# Altium footprint library smd-ipc.PCBLIB: 363 footprints (part 6 of 27)
Each footprint in its own frame and in the unit in brackets; x right, y up, seen from the top. Pads: shape width x height; smd on the part's side, far side on the other; paste and mask are expansions set on the pad; w line width, h text height; cw(c..) or ccw(c..) is an arc to the next point about the centre after c.
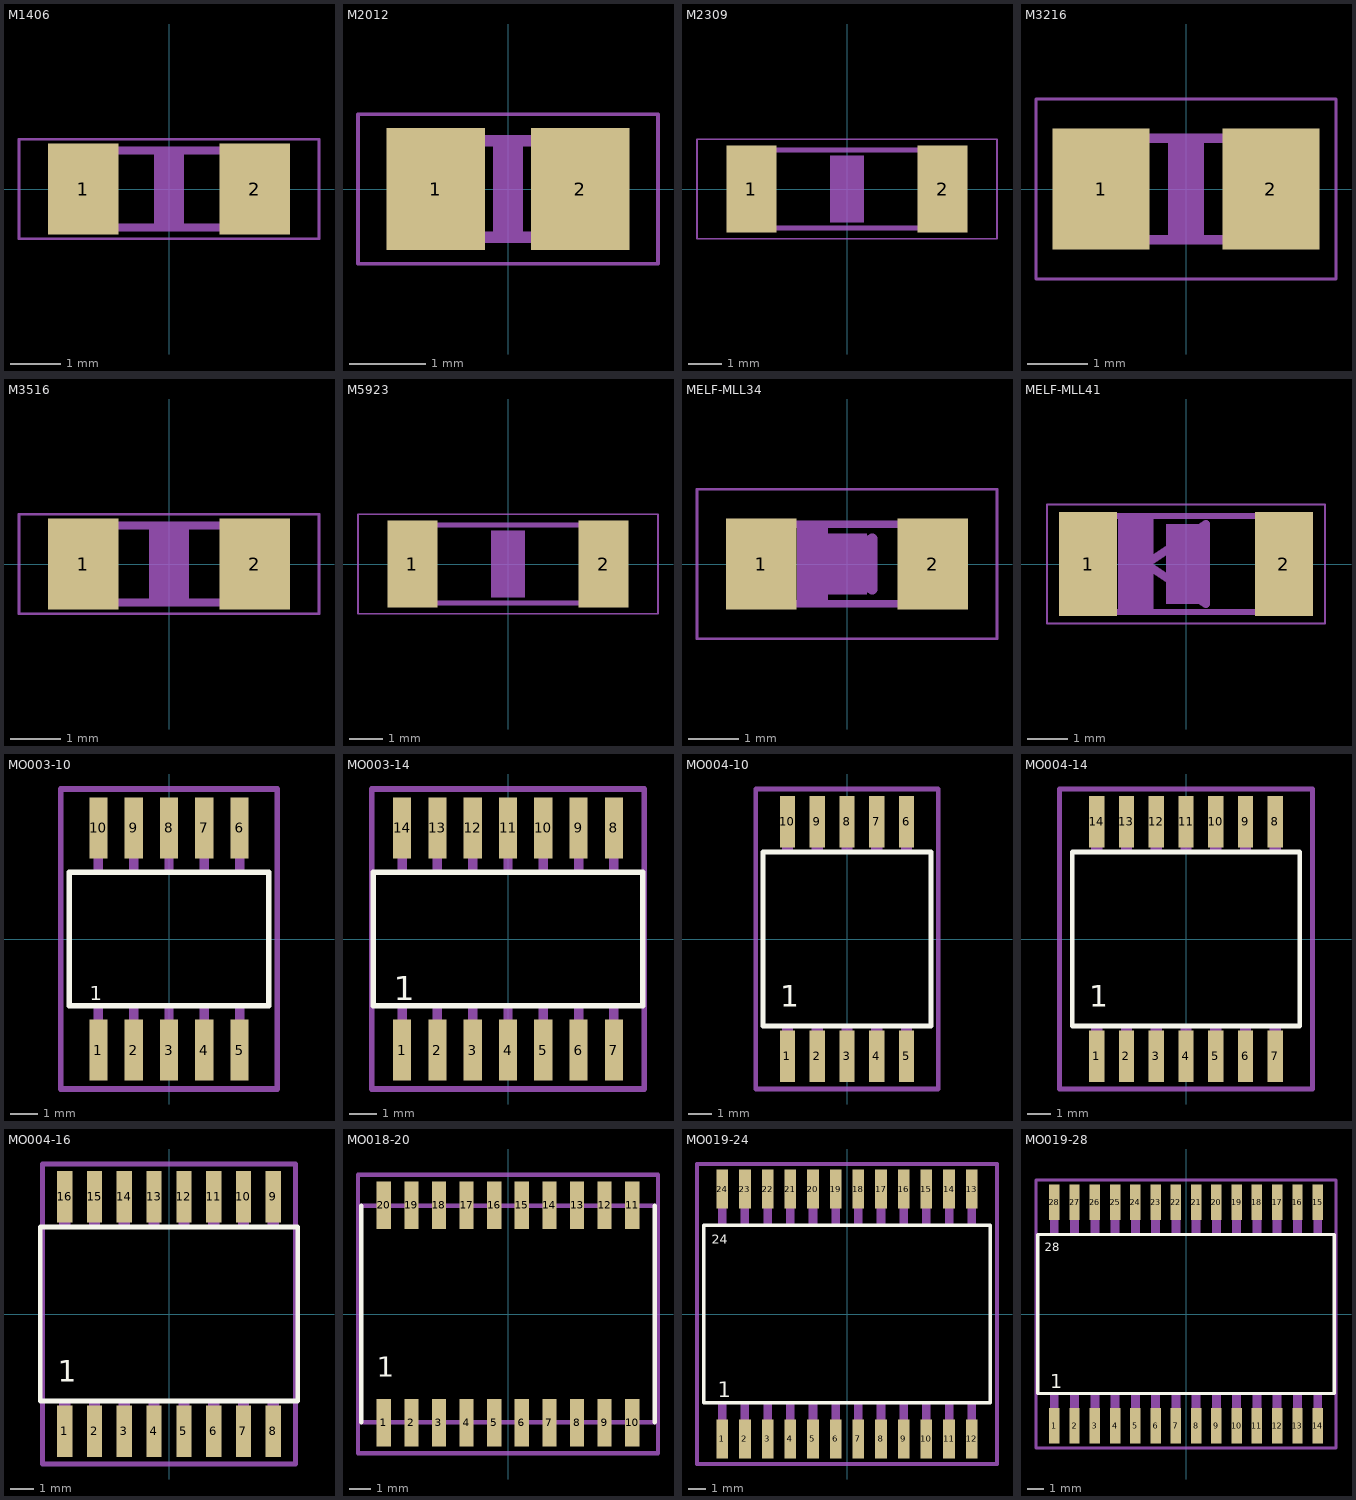
[diagram p5: the footprints below, top view; thin cyan lines are the x and y axes]

## M1406 [mm]
pads (2):
  rect 1.4x1.8 smd: 1(-1.7,0) 2(1.7,0)
Mechanical 6:
  rectangle: -0.3,-0.7 0.3,0.7
Mechanical 16:
  rectangle: -1.854,-0.838 -1.295,0.838
  rectangle: 1.295,-0.838 1.854,0.838
  lines w0.152: -1.321,-0.762 1.321,-0.762 ; -1.321,0.762 1.321,0.762
Mechanical 27:
  lines w0.051: -2.973,-0.983 2.973,-0.983 2.973,0.983 -2.973,0.983 -2.973,-0.983

## M2012 [mm]
pads (2):
  rect 1.3x1.6 smd: 1(-0.95,0) 2(0.95,0)
Mechanical 6:
  rectangle: -0.2,-0.6 0.2,0.6
Mechanical 16:
  rectangle: -1.041,-0.711 -0.686,0.711
  rectangle: 0.686,-0.711 1.041,0.711
  lines w0.152: -0.711,-0.635 0.711,-0.635 ; -0.711,0.635 0.711,0.635
Mechanical 27:
  lines w0.051: -1.973,-0.983 1.973,-0.983 1.973,0.983 -1.973,0.983 -1.973,-0.983

## M2309 [mm]
pads (2):
  rect 1.5x2.6 smd: 1(-2.85,0) 2(2.85,0)
Mechanical 6:
  rectangle: -0.5,-1 0.5,1
Mechanical 16:
  rectangle: -3.048,-1.245 -2.388,1.245
  rectangle: 2.388,-1.245 3.048,1.245
  lines w0.152: -2.438,1.168 2.413,1.168 ; -2.413,-1.168 2.413,-1.168
Mechanical 27:
  lines w0.051: -4.473,-1.483 4.473,-1.483 4.473,1.483 -4.473,1.483 -4.473,-1.483

## M3216 [mm]
pads (2):
  rect 1.6x2 smd: 1(-1.4,0) 2(1.4,0)
Mechanical 6:
  rectangle: -0.3,-0.8 0.3,0.8
Mechanical 16:
  rectangle: -1.702,-0.914 -1.118,0.914
  rectangle: 1.118,-0.914 1.702,0.914
  lines w0.152: -1.143,-0.838 1.143,-0.838 ; -1.143,0.838 1.143,0.838
Mechanical 27:
  lines w0.051: -2.473,-1.483 2.473,-1.483 2.473,1.483 -2.473,1.483 -2.473,-1.483

## M3516 [mm]
pads (2):
  rect 1.4x1.8 smd: 1(-1.7,0) 2(1.7,0)
Mechanical 6:
  rectangle: -0.4,-0.7 0.4,0.7
Mechanical 16:
  rectangle: -1.854,-0.838 -1.295,0.838
  rectangle: 1.295,-0.838 1.854,0.838
  lines w0.152: -1.321,-0.762 1.321,-0.762 ; -1.321,0.762 1.321,0.762
Mechanical 27:
  lines w0.051: -2.973,-0.983 2.973,-0.983 2.973,0.983 -2.973,0.983 -2.973,-0.983

## M5923 [mm]
pads (2):
  rect 1.5x2.6 smd: 1(-2.85,0) 2(2.85,0)
Mechanical 6:
  rectangle: -0.5,-1 0.5,1
Mechanical 16:
  rectangle: -3.048,-1.245 -2.388,1.245
  rectangle: 2.388,-1.245 3.048,1.245
  lines w0.152: -2.438,1.168 2.413,1.168 ; -2.413,-1.168 2.413,-1.168
Mechanical 27:
  lines w0.051: -4.473,-1.483 4.473,-1.483 4.473,1.483 -4.473,1.483 -4.473,-1.483

## MELF-MLL34 [mm]
pads (2):
  rect 1.4x1.8 smd: 1(-1.7,0) 2(1.7,0)
Mechanical 6:
  rectangle: -0.5,-0.6 0.4,0.6
Mechanical 16:
  rectangle: -1.854,-0.864 -1.295,0.864
  rectangle: 1.295,-0.864 1.854,0.864
  rectangle: -0.991,-0.787 -0.381,0.787
  lines w0.152: -1.321,-0.787 1.321,-0.787 ; -1.321,0.787 1.321,0.787
  lines w0.203: -0.5,0 0.5,0.5 0.5,-0.5 -0.5,0
Mechanical 27:
  lines w0.051: -2.973,-1.483 2.973,-1.483 2.973,1.483 -2.973,1.483 -2.973,-1.483

## MELF-MLL41 [mm]
pads (2):
  rect 1.45x2.6 smd: 1(-2.445,0) 2(2.445,0)
Mechanical 6:
  rectangle: -0.5,-1 0.5,1
Mechanical 16:
  rectangle: 2.057,-1.27 2.565,1.27
  rectangle: -2.616,-1.27 -2.108,1.27
  rectangle: -1.702,-1.194 -0.813,1.194
  lines w0.152: -2.159,1.194 2.083,1.194 ; -2.134,-1.194 2.083,-1.194
  lines w0.203: -1,0 0.5,1 0.5,-1 -1,0
Mechanical 27:
  lines w0.051: -3.473,-1.483 3.473,-1.483 3.473,1.483 -3.473,1.483 -3.473,-1.483

## MO003-10 [mm]
pads (10):
  rect 0.65x2.2 smd: 1(-2.54,-4) 2(-1.27,-4) 3(0,-4) 4(1.27,-4) 5(2.54,-4) 6(2.54,4) 7(1.27,4) 8(0,4) 9(-1.27,4) 10(-2.54,4)
Top Overlay:
  lines w0.203: -3.585,-2.4 3.585,-2.4 3.585,2.4 -3.585,2.4 -3.585,-2.4
  text "1" at -2.851,-2.205 h0.52
Mechanical 16:
  rectangle: -2.71,-4.8 -2.37,-2.4
  rectangle: -1.44,-4.8 -1.1,-2.4
  rectangle: -0.17,-4.8 0.17,-2.4
  rectangle: 1.1,-4.8 1.44,-2.4
  rectangle: 2.37,-4.8 2.71,-2.4
  rectangle: 2.37,2.4 2.71,4.8
  rectangle: 1.1,2.4 1.44,4.8
  rectangle: -0.17,2.4 0.17,4.8
  rectangle: -1.44,2.4 -1.1,4.8
  rectangle: -2.71,2.4 -2.37,4.8
Mechanical 27:
  lines w0.2: -3.9,-5.4 -3.9,5.4 3.9,5.4 3.9,-5.4 -3.9,-5.4

## MO003-14 [mm]
pads (14):
  rect 0.65x2.2 smd: 1(-3.81,-4) 2(-2.54,-4) 3(-1.27,-4) 4(0,-4) 5(1.27,-4) 6(2.54,-4) 7(3.81,-4) 8(3.81,4) 9(2.54,4) 10(1.27,4) 11(0,4) 12(-1.27,4) 13(-2.54,4) 14(-3.81,4)
Top Overlay:
  lines w0.203: -4.855,-2.4 4.855,-2.4 4.855,2.4 -4.855,2.4 -4.855,-2.4
  text "1" at -4.121,-2.205 h0.86
Mechanical 16:
  rectangle: -3.98,-4.8 -3.64,-2.4
  rectangle: -2.71,-4.8 -2.37,-2.4
  rectangle: -1.44,-4.8 -1.1,-2.4
  rectangle: -0.17,-4.8 0.17,-2.4
  rectangle: 1.1,-4.8 1.44,-2.4
  rectangle: 2.37,-4.8 2.71,-2.4
  rectangle: 3.64,-4.8 3.98,-2.4
  rectangle: 3.64,2.4 3.98,4.8
  rectangle: 2.37,2.4 2.71,4.8
  rectangle: 1.1,2.4 1.44,4.8
  rectangle: -0.17,2.4 0.17,4.8
  rectangle: -1.44,2.4 -1.1,4.8
  rectangle: -2.71,2.4 -2.37,4.8
  rectangle: -3.98,2.4 -3.64,4.8
Mechanical 27:
  lines w0.2: -4.9,-5.4 -4.9,5.4 4.9,5.4 4.9,-5.4 -4.9,-5.4

## MO004-10 [mm]
pads (10):
  rect 0.65x2.2 smd: 1(-2.54,-5) 2(-1.27,-5) 3(0,-5) 4(1.27,-5) 5(2.54,-5) 6(2.54,5) 7(1.27,5) 8(0,5) 9(-1.27,5) 10(-2.54,5)
Top Overlay:
  lines w0.203: -3.585,-3.71 3.585,-3.71 3.585,3.71 -3.585,3.71 -3.585,-3.71
  text "1" at -2.851,-3.205 h1.57
Mechanical 16:
  rectangle: -2.78,-5.8 -2.3,-3.71
  rectangle: -1.51,-5.8 -1.03,-3.71
  rectangle: -0.24,-5.8 0.24,-3.71
  rectangle: 1.03,-5.8 1.51,-3.71
  rectangle: 2.3,-5.8 2.78,-3.71
  rectangle: 2.3,3.71 2.78,5.8
  rectangle: 1.03,3.71 1.51,5.8
  rectangle: -0.24,3.71 0.24,5.8
  rectangle: -1.51,3.71 -1.03,5.8
  rectangle: -2.78,3.71 -2.3,5.8
Mechanical 27:
  lines w0.2: -3.9,-6.4 -3.9,6.4 3.9,6.4 3.9,-6.4 -3.9,-6.4

## MO004-14 [mm]
pads (14):
  rect 0.65x2.2 smd: 1(-3.81,-5) 2(-2.54,-5) 3(-1.27,-5) 4(0,-5) 5(1.27,-5) 6(2.54,-5) 7(3.81,-5) 8(3.81,5) 9(2.54,5) 10(1.27,5) 11(0,5) 12(-1.27,5) 13(-2.54,5) 14(-3.81,5)
Top Overlay:
  lines w0.203: -4.855,-3.71 4.855,-3.71 4.855,3.71 -4.855,3.71 -4.855,-3.71
  text "1" at -4.121,-3.205 h1.57
Mechanical 16:
  rectangle: -4.05,-5.8 -3.57,-3.71
  rectangle: -2.78,-5.8 -2.3,-3.71
  rectangle: -1.51,-5.8 -1.03,-3.71
  rectangle: -0.24,-5.8 0.24,-3.71
  rectangle: 1.03,-5.8 1.51,-3.71
  rectangle: 2.3,-5.8 2.78,-3.71
  rectangle: 3.57,-5.8 4.05,-3.71
  rectangle: 3.57,3.71 4.05,5.8
  rectangle: 2.3,3.71 2.78,5.8
  rectangle: 1.03,3.71 1.51,5.8
  rectangle: -0.24,3.71 0.24,5.8
  rectangle: -1.51,3.71 -1.03,5.8
  rectangle: -2.78,3.71 -2.3,5.8
  rectangle: -4.05,3.71 -3.57,5.8
Mechanical 27:
  lines w0.2: -5.4,-6.4 -5.4,6.4 5.4,6.4 5.4,-6.4 -5.4,-6.4

## MO004-16 [mm]
pads (16):
  rect 0.65x2.2 smd: 1(-4.445,-5) 2(-3.175,-5) 3(-1.905,-5) 4(-0.635,-5) 5(0.635,-5) 6(1.905,-5) 7(3.175,-5) 8(4.445,-5) 9(4.445,5) 10(3.175,5) 11(1.905,5) 12(0.635,5) 13(-0.635,5) 14(-1.905,5) 15(-3.175,5) 16(-4.445,5)
Top Overlay:
  lines w0.203: -5.49,-3.71 5.49,-3.71 5.49,3.71 -5.49,3.71 -5.49,-3.71
  text "1" at -4.756,-3.205 h1.57
Mechanical 16:
  rectangle: -4.685,-5.8 -4.205,-3.71
  rectangle: -3.415,-5.8 -2.935,-3.71
  rectangle: -2.145,-5.8 -1.665,-3.71
  rectangle: -0.875,-5.8 -0.395,-3.71
  rectangle: 0.395,-5.8 0.875,-3.71
  rectangle: 1.665,-5.8 2.145,-3.71
  rectangle: 2.935,-5.8 3.415,-3.71
  rectangle: 4.205,-5.8 4.685,-3.71
  rectangle: 4.205,3.71 4.685,5.8
  rectangle: 2.935,3.71 3.415,5.8
  rectangle: 1.665,3.71 2.145,5.8
  rectangle: 0.395,3.71 0.875,5.8
  rectangle: -0.875,3.71 -0.395,5.8
  rectangle: -2.145,3.71 -1.665,5.8
  rectangle: -3.415,3.71 -2.935,5.8
  rectangle: -4.685,3.71 -4.205,5.8
Mechanical 27:
  lines w0.2: -5.4,-6.4 -5.4,6.4 5.4,6.4 5.4,-6.4 -5.4,-6.4

## MO018-20 [mm]
pads (20):
  rect 0.65x2.2 smd: 1(-5.715,-5) 2(-4.445,-5) 3(-3.175,-5) 4(-1.905,-5) 5(-0.635,-5) 6(0.635,-5) 7(1.905,-5) 8(3.175,-5) 9(4.445,-5) 10(5.715,-5) 11(5.715,5) 12(4.445,5) 13(3.175,5) 14(1.905,5) 15(0.635,5) 16(-0.635,5) 17(-1.905,5) 18(-3.175,5) 19(-4.445,5) 20(-5.715,5)
Top Overlay:
  lines w0.203: -6.745,-4.98 -6.745,4.98 ; 6.745,-4.98 6.745,4.98
  text "1" at -6.026,-3.205 h1.57
Mechanical 16:
  rectangle: -5.885,-5.8 -5.545,-4.98
  rectangle: -4.615,-5.8 -4.275,-4.98
  rectangle: -3.345,-5.8 -3.005,-4.98
  rectangle: -2.075,-5.8 -1.735,-4.98
  rectangle: -0.805,-5.8 -0.465,-4.98
  rectangle: 0.465,-5.8 0.805,-4.98
  rectangle: 1.735,-5.8 2.075,-4.98
  rectangle: 3.005,-5.8 3.345,-4.98
  rectangle: 4.275,-5.8 4.615,-4.98
  rectangle: 5.545,-5.8 5.885,-4.98
  rectangle: 5.545,4.98 5.885,5.8
  rectangle: 4.275,4.98 4.615,5.8
  rectangle: 3.005,4.98 3.345,5.8
  rectangle: 1.735,4.98 2.075,5.8
  rectangle: 0.465,4.98 0.805,5.8
  rectangle: -0.805,4.98 -0.465,5.8
  rectangle: -2.075,4.98 -1.735,5.8
  rectangle: -3.345,4.98 -3.005,5.8
  rectangle: -4.615,4.98 -4.275,5.8
  rectangle: -5.885,4.98 -5.545,5.8
  lines w0.203: -6.745,-4.98 6.745,-4.98 ; -6.745,4.98 6.745,4.98
Mechanical 27:
  lines w0.2: -6.9,-6.4 -6.9,6.4 6.9,6.4 6.9,-6.4 -6.9,-6.4

## MO019-24 [mm]
pads (24):
  rect 0.65x2.2 smd: 1(-6.985,-7) 2(-5.715,-7) 3(-4.445,-7) 4(-3.175,-7) 5(-1.905,-7) 6(-0.635,-7) 7(0.635,-7) 8(1.905,-7) 9(3.175,-7) 10(4.445,-7) 11(5.715,-7) 12(6.985,-7) 13(6.985,7) 14(5.715,7) 15(4.445,7) 16(3.175,7) 17(1.905,7) 18(0.635,7) 19(-0.635,7) 20(-1.905,7) 21(-3.175,7) 22(-4.445,7) 23(-5.715,7) 24(-6.985,7)
Top Overlay:
  lines w0.203: -8.015,-4.98 8.015,-4.98 8.015,4.98 -8.015,4.98 -8.015,-4.98
  text "1" at -7.236,-4.665 h0.86
  text "24" at -7.576,3.93 h0.52
Mechanical 16:
  rectangle: -7.225,-7.8 -6.745,-5
  rectangle: -5.955,-7.8 -5.475,-5
  rectangle: -4.685,-7.8 -4.205,-5
  rectangle: -3.415,-7.8 -2.935,-5
  rectangle: -2.145,-7.8 -1.665,-5
  rectangle: -0.875,-7.8 -0.395,-5
  rectangle: 0.395,-7.8 0.875,-5
  rectangle: 1.665,-7.8 2.145,-5
  rectangle: 2.935,-7.8 3.415,-5
  rectangle: 4.205,-7.8 4.685,-5
  rectangle: 5.475,-7.8 5.955,-5
  rectangle: 6.745,-7.8 7.225,-5
  rectangle: 6.745,5 7.225,7.8
  rectangle: 5.475,5 5.955,7.8
  rectangle: 4.205,5 4.685,7.8
  rectangle: 2.935,5 3.415,7.8
  rectangle: 1.665,5 2.145,7.8
  rectangle: 0.395,5 0.875,7.8
  rectangle: -0.875,5 -0.395,7.8
  rectangle: -2.145,5 -1.665,7.8
  rectangle: -3.415,5 -2.935,7.8
  rectangle: -4.685,5 -4.205,7.8
  rectangle: -5.955,5 -5.475,7.8
  rectangle: -7.225,5 -6.745,7.8
Mechanical 27:
  lines w0.2: -8.4,-8.4 -8.4,8.4 8.4,8.4 8.4,-8.4 -8.4,-8.4

## MO019-28 [mm]
pads (28):
  rect 0.65x2.2 smd: 1(-8.255,-7) 2(-6.985,-7) 3(-5.715,-7) 4(-4.445,-7) 5(-3.175,-7) 6(-1.905,-7) 7(-0.635,-7) 8(0.635,-7) 9(1.905,-7) 10(3.175,-7) 11(4.445,-7) 12(5.715,-7) 13(6.985,-7) 14(8.255,-7) 15(8.255,7) 16(6.985,7) 17(5.715,7) 18(4.445,7) 19(3.175,7) 20(1.905,7) 21(0.635,7) 22(-0.635,7) 23(-1.905,7) 24(-3.175,7) 25(-4.445,7) 26(-5.715,7) 27(-6.985,7) 28(-8.255,7)
Top Overlay:
  lines w0.203: -9.285,-4.98 9.285,-4.98 9.285,4.98 -9.285,4.98 -9.285,-4.98
  text "1" at -8.506,-4.665 h0.86
  text "28" at -8.846,3.93 h0.52
Mechanical 16:
  rectangle: -8.535,-7.8 -7.975,-5
  rectangle: -7.265,-7.8 -6.705,-5
  rectangle: -5.995,-7.8 -5.435,-5
  rectangle: -4.725,-7.8 -4.165,-5
  rectangle: -3.455,-7.8 -2.895,-5
  rectangle: -2.185,-7.8 -1.625,-5
  rectangle: -0.915,-7.8 -0.355,-5
  rectangle: 0.355,-7.8 0.915,-5
  rectangle: 1.625,-7.8 2.185,-5
  rectangle: 2.895,-7.8 3.455,-5
  rectangle: 4.165,-7.8 4.725,-5
  rectangle: 5.435,-7.8 5.995,-5
  rectangle: 6.705,-7.8 7.265,-5
  rectangle: 7.975,-7.8 8.535,-5
  rectangle: 7.975,5 8.535,7.8
  rectangle: 6.705,5 7.265,7.8
  rectangle: 5.435,5 5.995,7.8
  rectangle: 4.165,5 4.725,7.8
  rectangle: 2.895,5 3.455,7.8
  rectangle: 1.625,5 2.185,7.8
  rectangle: 0.355,5 0.915,7.8
  rectangle: -0.915,5 -0.355,7.8
  rectangle: -2.185,5 -1.625,7.8
  rectangle: -3.455,5 -2.895,7.8
  rectangle: -4.725,5 -4.165,7.8
  rectangle: -5.995,5 -5.435,7.8
  rectangle: -7.265,5 -6.705,7.8
  rectangle: -8.535,5 -7.975,7.8
Mechanical 27:
  lines w0.2: -9.4,-8.4 -9.4,8.4 9.4,8.4 9.4,-8.4 -9.4,-8.4